# Altium footprint library PcbLib.PcbLib: 101 footprints (part 4 of 7)
Each footprint in its own frame and in the unit in brackets; x right, y up, seen from the top. Pads: shape width x height; smd on the part's side, far side on the other; paste and mask are expansions set on the pad; w line width, h text height; cw(c..) or ccw(c..) is an arc to the next point about the centre after c.
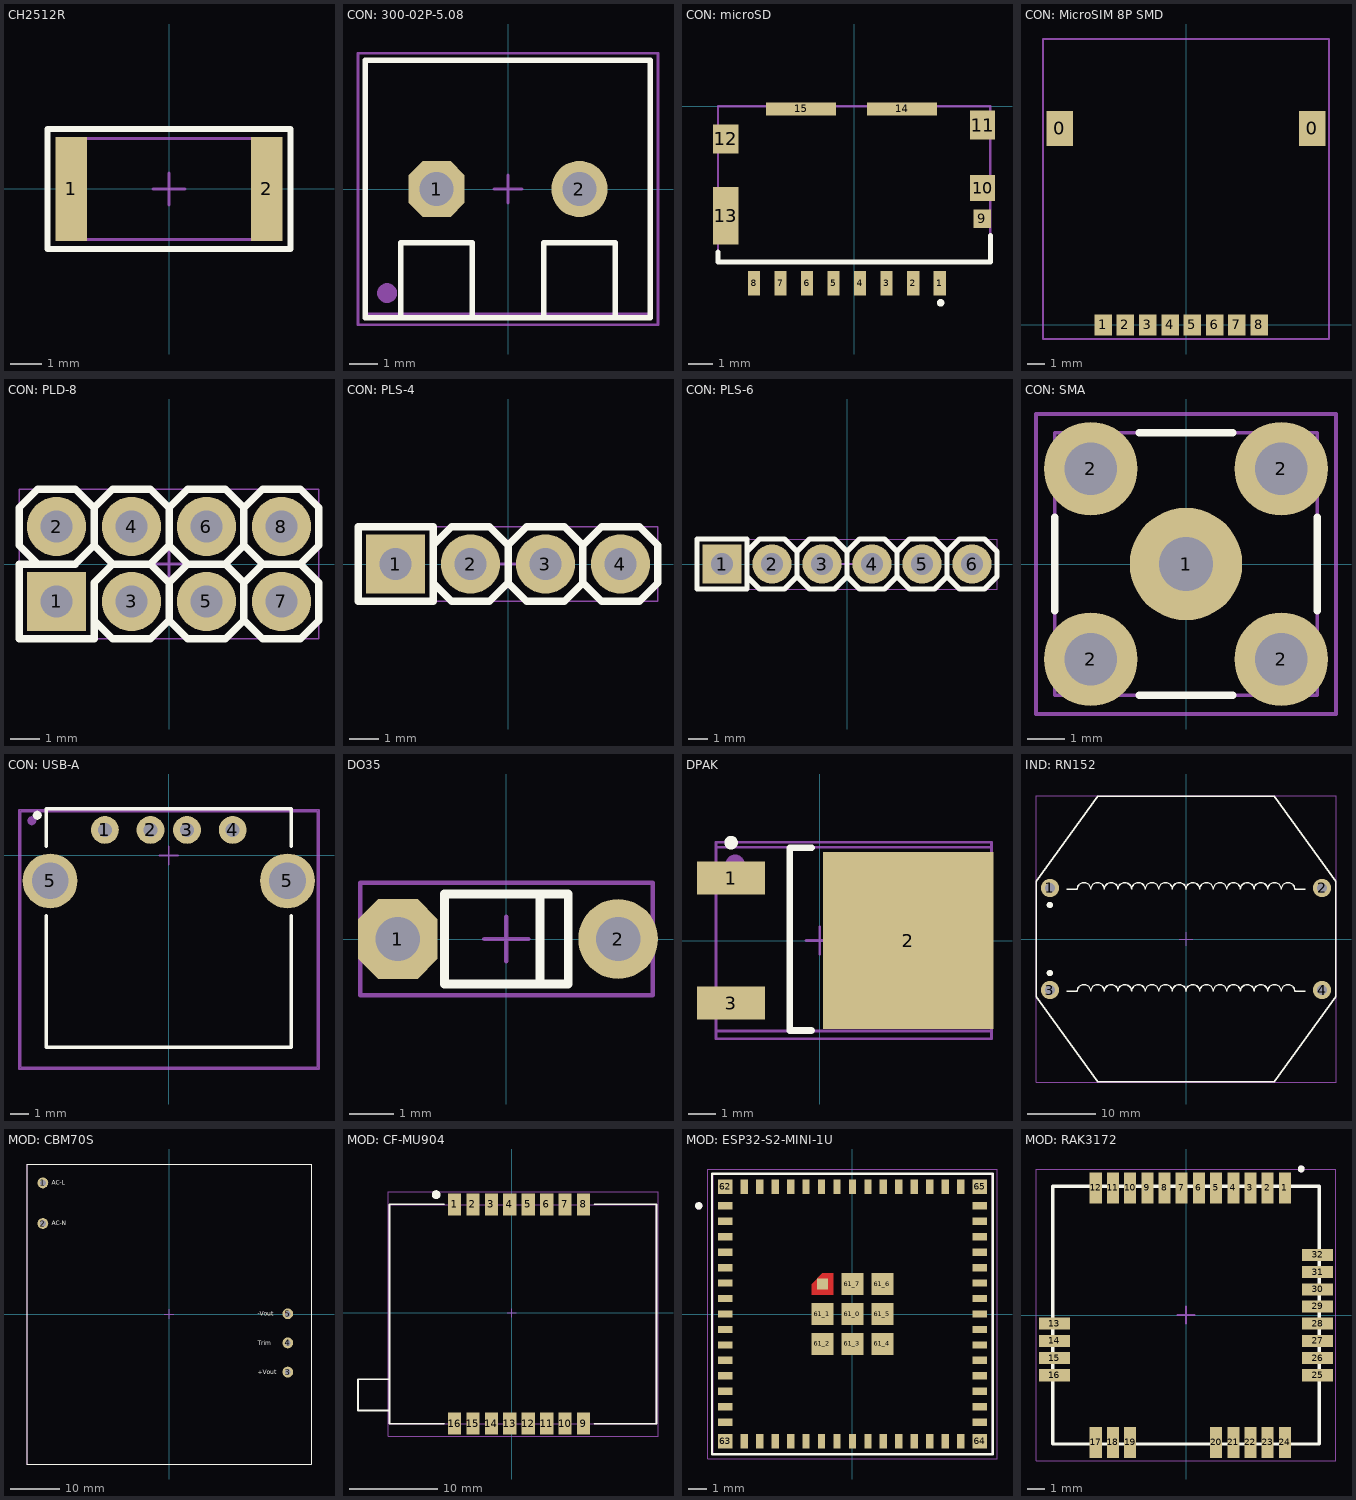
[diagram p3: the footprints below, top view; thin cyan lines are the x and y axes]

## CH2512R [mm]
height 0.55
pads (2):
  rect 1x3.3 smd: 1(-3.1,0) 2(3.1,0)
Top Overlay:
  lines w0.2: -3.85,-1.9 -3.85,1.9 3.85,1.9 3.85,-1.9 -3.85,-1.9
Top Assy:
  lines w0.1: -3.175,-1.6 -3.175,1.6 3.175,1.6 3.175,-1.6 -3.175,-1.6
Top Courtyard (Mech15):
  lines w0.1: -0.5,0 0.5,0 ; 0,-0.5 0,0.5 ; -3.85,-1.9 3.85,-1.9 3.85,1.9 -3.85,1.9 -3.85,-1.9
3D body "chip_2512_r.STEP": height 0.52, standoff -0.04, extent -3.175,-1.6 3.175,1.6

## CON: 300-02P-5.08 [mm] "2 pin 5.08mm screw connector"
height 12.5
pads (2):
  oct 2x2 hole 1.2: 1(-2.54,0)
  round 2 hole 1.2: 2(2.54,0)
Top Overlay:
  lines w0.2: -3.81,-4.572 -3.81,-1.905 -1.27,-1.905 -1.27,-4.445 ; 1.27,-4.572 1.27,-1.905 3.81,-1.905 3.81,-4.445 ; -5.08,-4.572 5.063,-4.572 5.063,4.572 -5.08,4.572 -5.08,-4.572
Top Assy:
  circle w0.5: c-4.3,-3.7 r0.1
  lines w0.1: -5.08,-4.445 -5.08,4.555 5.08,4.555 5.08,-4.445 -5.08,-4.445
Top Courtyard (Mech15):
  lines w0.1: -0.5,0 0.5,0 ; 0,-0.5 0,0.5 ; -5.334,-4.826 5.334,-4.826 5.334,4.826 -5.334,4.826 -5.334,-4.826
3D body "300-02.STEP": height 12.5, standoff -4, extent -5.08,-4.445 5.08,4.555

## CON: microSD [mm]
pads (15):
  rect 0.5x1 smd: 1(3.55,-7.34) 2(2.45,-7.34) 3(1.35,-7.34) 4(0.25,-7.34) 5(-0.85,-7.34) 6(-1.95,-7.34) 7(-3.05,-7.34) 8(-4.15,-7.34)
  rect 0.72x0.78 smd: 9(5.31,-4.66)
  rect 1.05x1.08 smd: 10(5.325,-3.39)
  rect 1.05x1.2 smd: 11(5.325,-0.78) 12(-5.325,-1.35)
  rect 1.05x2.39 smd: 13(-5.325,-4.535)
  rect 2.91x0.55 smd: 14(1.986,-0.105) 15(-2.204,-0.105)
Top Overlay:
  circle w0.2: c3.584,-8.15 r0.057
  lines w0.2: -5.65,-6.028 -5.65,-6.45 5.65,-6.45 5.65,-5.355
Top Assy:
  lines w0.1: -5.65,-6.45 -5.65,0 5.65,0 5.65,-6.45 -5.65,-6.45
3D body "1051620001--3DModel-STEP-56544.STEP": height 1.45, standoff 0, extent -5.65,-7.6 5.65,0

## CON: MicroSIM 8P SMD [mm] "8 Position Card Connector Micro SIM Surface Mount, Right Angle Gold"
height 1.95
pads (10):
  rect 1.5x2 smd: 0(-7.2,11.2) 0(7.2,11.2)
  rect 1x1.2 smd: 1(-4.72,0) 2(-3.45,0) 3(-2.18,0) 4(-0.91,0) 5(0.36,0) 6(1.63,0) 7(2.9,0) 8(4.17,0)
Top Courtyard (Mech15):
  lines w0.1: -8.15,-0.8 -8.15,16.3 8.15,16.3 8.15,-0.8 -8.15,-0.8

## CON: PLD-8 [mm] "PLD-40 8 pin header"
height 10
pads (8):
  rect 2x2 hole 1.1: 1(-3.81,-1.27)
  round 2 hole 1.1: 2(-3.81,1.27) 3(-1.27,-1.27) 4(-1.27,1.27) 5(1.27,-1.27) 6(1.27,1.27) 7(3.81,-1.27) 8(3.81,1.27)
Top Overlay:
  lines w0.254: -4.445,0 -5.08,0.635 -5.08,1.905 -4.445,2.54 ; -2.54,-1.905 -1.905,-2.54 -0.635,-2.54 0,-1.905 ; -4.445,2.54 -3.175,2.54 ; -4.445,2.54 -3.175,2.54 ; -3.175,2.54 -2.54,1.905 ; -2.54,0.635 -1.905,0 ; -2.54,0.635 -3.175,0 -5.08,0 -5.08,-2.54 -2.54,-2.54 -2.54,-0.635 -1.905,0 ; -2.54,0.635 -2.54,1.905 ; -2.54,1.905 -1.905,2.54 ; -1.905,0 -0.635,0 ; -1.905,2.54 -0.635,2.54 ; -1.905,2.54 -0.635,2.54 ; -0.635,0 0,0.635 ; -0.635,0 0,-0.635 ; -0.635,2.54 0,1.905 ; 0,-1.905 0.635,-2.54 1.905,-2.54 2.54,-1.905 ; 0,-1.905 0,-0.635 ; 0,-0.635 0.635,0 ; 0,0.635 0,1.905 ; 0,0.635 0.635,0 ; 0,1.905 0.635,2.54 ; 0.635,0 1.905,0 ; 0.635,2.54 1.905,2.54 ; 0.635,2.54 1.905,2.54 ; 1.905,0 2.54,0.635 ; 1.905,0 2.54,-0.635 ; 1.905,2.54 2.54,1.905 ; 2.54,-1.905 3.175,-2.54 4.445,-2.54 5.08,-1.905 5.08,-0.635 4.445,0 ; 2.54,-1.905 2.54,-0.635 ; 2.54,-0.635 3.175,0 ; 2.54,0.635 2.54,1.905 ; 2.54,0.635 3.175,0 ; 2.54,1.905 3.175,2.54 ; 3.175,0 4.445,0 ; 3.175,2.54 4.445,2.54 ; 3.175,2.54 4.445,2.54 ; 4.445,0 5.08,0.635 5.08,1.905 4.445,2.54
Top Assy:
  lines w0.1: -4.445,0 -5.08,0.635 -5.08,1.905 -4.445,2.54 -3.175,2.54 -2.54,1.905 -1.905,2.54 -0.635,2.54 0,1.905 ; -2.54,-1.905 -1.905,-2.54 -0.635,-2.54 0,-1.905 ; -1.905,0 -2.54,-0.635 -2.54,-2.54 -5.08,-2.54 -5.08,0 -3.175,0 -2.54,0.635 -1.905,0 ; -1.905,0 -0.635,0 ; -0.635,0 0,-0.635 ; -0.635,0 0,0.635 ; 0,-1.905 0.635,-2.54 1.905,-2.54 2.54,-1.905 ; 0,-1.905 0,-0.635 ; 0,-0.635 0.635,0 ; 0,0.635 0.635,0 ; 0,0.635 0,1.905 ; 0,1.905 0.635,2.54 1.905,2.54 2.54,1.905 ; 0.635,0 1.905,0 ; 1.905,0 2.54,-0.635 ; 1.905,0 2.54,0.635 ; 2.54,-1.905 3.175,-2.54 4.445,-2.54 5.08,-1.905 5.08,-0.635 4.445,0 ; 2.54,-1.905 2.54,-0.635 ; 2.54,-0.635 3.175,0 ; 2.54,0.635 3.175,0 ; 2.54,0.635 2.54,1.905 ; 2.54,1.905 3.175,2.54 4.445,2.54 5.08,1.905 5.08,0.635 4.445,0 ; 3.175,0 4.445,0
Top Courtyard (Mech15):
  lines w0.05: -5.08,-2.54 -5.08,2.54 5.08,2.54 5.08,-2.54 -5.08,-2.54
  lines w0.1: -0.5,0 0.5,0 ; 0,-0.5 0,0.5
3D body "PLD-8.STEP": height 8.54, standoff -3, extent -5.132,-2.546 5.028,2.534

## CON: PLS-4 [mm] "PLS-40 4 pin header"
height 10
pads (4):
  rect 2x2 hole 1.1: 1(-3.81,0)
  round 2 hole 1.1: 2(-1.27,0) 3(1.27,0) 4(3.81,0)
Top Overlay:
  lines w0.254: -2.54,-0.635 -1.905,-1.27 -0.635,-1.27 0,-0.635 ; -2.54,0.635 -1.905,1.27 -0.635,1.27 0,0.635 ; 0,-0.635 0.635,-1.27 1.905,-1.27 2.54,-0.635 ; 0,-0.635 0,0.635 ; 0,0.635 0.635,1.27 1.905,1.27 2.54,0.635 ; 2.54,-0.635 3.175,-1.27 4.445,-1.27 5.08,-0.635 5.08,0.635 4.445,1.27 3.175,1.27 2.54,0.635 ; 2.54,-0.635 2.54,0.635 ; -5.08,-1.27 -2.54,-1.27 -2.54,1.27 -5.08,1.27 -5.08,-1.27
Top Assy:
  lines w0.1: -2.54,-0.635 -1.905,-1.27 -0.635,-1.27 0,-0.635 ; -2.54,0.635 -1.905,1.27 -0.635,1.27 0,0.635 ; 0,-0.635 0.635,-1.27 1.905,-1.27 2.54,-0.635 ; 0,-0.635 0,0.635 ; 0,0.635 0.635,1.27 1.905,1.27 2.54,0.635 ; 2.54,-0.635 3.175,-1.27 4.445,-1.27 5.08,-0.635 5.08,0.635 4.445,1.27 3.175,1.27 2.54,0.635 ; 2.54,-0.635 2.54,0.635 ; -5.08,-1.27 -5.08,1.27 -2.54,1.27 -2.54,-1.27 -5.08,-1.27
Top Courtyard (Mech15):
  lines w0.05: -5.08,-1.27 -5.08,1.27 5.08,1.27 5.08,-1.27 -5.08,-1.27
  lines w0.1: -0.5,0 0.5,0 ; 0,-0.5 0,0.5
3D body "PLS-4.STEP": height 8.54, standoff -3, extent -5.08,-1.27 5.08,1.27

## CON: PLS-6 [mm]
height 10
pads (6):
  rect 2x2 hole 1.1: 1(-6.35,0)
  round 2 hole 1.1: 2(-3.81,0) 3(-1.27,0) 4(1.27,0) 5(3.81,0) 6(6.35,0)
Top Overlay:
  lines w0.254: -5.08,-0.635 -4.445,-1.27 -3.175,-1.27 -2.54,-0.635 ; -5.08,0.635 -4.445,1.27 -3.175,1.27 -2.54,0.635 ; -2.54,-0.635 -1.905,-1.27 -0.635,-1.27 0,-0.635 ; -2.54,-0.635 -2.54,0.635 ; -2.54,0.635 -1.905,1.27 -0.635,1.27 0,0.635 ; 0,-0.635 0.635,-1.27 1.905,-1.27 2.54,-0.635 ; 0,-0.635 0,0.635 ; 0,0.635 0.635,1.27 1.905,1.27 2.54,0.635 ; 2.54,-0.635 3.175,-1.27 4.445,-1.27 5.08,-0.635 ; 2.54,-0.635 2.54,0.635 ; 2.54,0.635 3.175,1.27 4.445,1.27 5.08,0.635 ; 5.08,-0.635 5.08,0.635 ; 5.08,-0.635 5.715,-1.27 6.985,-1.27 7.62,-0.635 7.62,0.635 6.985,1.27 5.715,1.27 5.08,0.635 ; -7.62,-1.27 -5.08,-1.27 -5.08,1.27 -7.62,1.27 -7.62,-1.27
Top Assy:
  lines w0.1: -5.08,-0.635 -4.445,-1.27 -3.175,-1.27 -2.54,-0.635 ; -5.08,0.635 -4.445,1.27 -3.175,1.27 -2.54,0.635 ; -2.54,-0.635 -1.905,-1.27 -0.635,-1.27 0,-0.635 ; -2.54,-0.635 -2.54,0.635 ; -2.54,0.635 -1.905,1.27 -0.635,1.27 0,0.635 ; 0,-0.635 0,0.635 ; 0,-0.635 0.635,-1.27 1.905,-1.27 2.54,-0.635 ; 0,0.635 0.635,1.27 1.905,1.27 2.54,0.635 ; 2.54,-0.635 2.54,0.635 ; 2.54,-0.635 3.175,-1.27 4.445,-1.27 5.08,-0.635 ; 2.54,0.635 3.175,1.27 4.445,1.27 5.08,0.635 ; 5.08,-0.635 5.08,0.635 ; 5.08,-0.635 5.715,-1.27 6.985,-1.27 7.62,-0.635 7.62,0.635 6.985,1.27 5.715,1.27 5.08,0.635 ; -7.62,-1.27 -5.08,-1.27 -5.08,1.27 -7.62,1.27 -7.62,-1.27
Top Courtyard (Mech15):
  lines w0.05: -7.62,-1.27 -7.62,1.27 7.62,1.27 7.62,-1.27 -7.62,-1.27
  lines w0.1: -0.5,0 0.5,0 ; 0,-0.5 0,0.5
3D body "PLS-6.STEP": height 8.54, standoff -3, extent -7.62,-1.27 7.62,1.27

## CON: SMA [mm]
pads (5):
  round 3 hole 1.45: 1(0,0)
  round 2.5 hole 1.4: 2(-2.54,-2.54) 2(-2.54,2.54) 2(2.54,-2.54) 2(2.54,2.54)
Top Overlay:
  lines w0.2: -3.5,-1.25 -3.5,1.25 ; -1.25,-3.5 1.25,-3.5 ; -1.25,3.5 1.25,3.5 ; 3.5,-1.25 3.5,1.25
Mechanical 1:
  lines w0.1: -3.5,-3.5 3.5,-3.5 3.5,3.5 -3.5,3.5 -3.5,-3.5
Top Courtyard (Mech15):
  lines w0.1: -0.5,0 0.5,0 ; 0,-0.5 0,0.5 ; -4,-4 -4,4 4,4 4,-4 -4,-4
3D body "SMA_connector.STEP": height 9.53, standoff -3.94, extent -3.5,-3.5 3.5,3.5

## CON: USB-A [mm]
height 5
pads (8):
  round 1.524 hole 0.762: 1(-3.5,1.397) 2(-1,1.397) 3(1,1.397) 4(3.5,1.397)
  round 3 hole 2: 5(-6.5,-1.397) 5(6.5,-1.397)
  round 0.5 on Mech13: ""(-7.5,1.9)
  round 0.5 on Top Overlay: ""(-7.2,2.2)
Top Overlay:
  lines w0.2: -6.7,-3.294 -6.7,-10.5 6.7,-10.5 6.7,-3.294 ; -6.7,0.5 -6.7,2.55 6.7,2.55 6.7,0.5
Top Assy:
  lines w0.1: -8.105,-11.593 -8.105,2.407 8.129,2.407 8.129,-11.593 -8.105,-11.593
Top Courtyard (Mech15):
  lines w0.1: -0.5,0 0.5,0 ; 0,-0.5 0,0.5 ; -8.2,-11.7 8.225,-11.7 8.225,2.5 -8.2,2.5 -8.2,-11.7
3D body "USB_A_PCB.STEP": height 7.66, standoff -3.62, extent -8.105,-11.593 8.129,2.407

## DO35 [mm]
height 3
pads (2):
  oct 1.8x1.8 hole 1: 1(-2.45,0)
  round 1.8 hole 1: 2(2.525,0)
Top Overlay:
  lines w0.2: 0.762,-1.016 0.762,1.016 ; -1.397,-1.016 1.397,-1.016 1.397,1.016 -1.397,1.016 -1.397,-1.016
Top Assy:
  lines w0.1: 0.762,-1.016 0.762,1.016 ; -1.397,-1.016 -1.397,1.016 1.397,1.016 1.397,-1.016 -1.397,-1.016
Top Courtyard (Mech15):
  lines w0.1: -0.5,0 0.5,0 ; 0,-0.5 0,0.5 ; -3.302,-1.27 3.302,-1.27 3.302,1.27 -3.302,1.27 -3.302,-1.27
3D body "DO-35.step": height 2.75, standoff -1.35, extent -2.7,-0.75 2.8,0.75

## DPAK [mm] "D-Pak, Body 6,2x6,7mm"
height 2.4
pads (3):
  rect 2.5x1.2 smd: 1(-3.25,2.29) 3(-3.25,-2.29)
  rect 6.25x6.5 smd: 2(3.25,0)
Top Overlay:
  circle w0.25: c-3.25,3.59 r0.125
  lines w0.25: -0.3,-3.3 -1.1,-3.3 -1.1,3.4 -0.3,3.4
Top Assy:
  circle w0.5: c-3.1,2.8 r0.1
  lines w0.1: -3.798,-3.317 -3.798,-3.317 ; -3.798,-3.317 -3.798,3.417 6.302,3.417 ; -3.798,-3.317 6.302,-3.317 6.302,3.417 ; 6.302,3.417 6.302,3.417
Top Courtyard (Mech15):
  lines w0.1: -0.5,0 0.5,0 ; 0,-0.5 0,0.5 ; -3.8,-3.6 -3.8,3.6 6.3,3.6 6.3,-3.6 -3.8,-3.6
3D body "User Library-DPAK_TO-252AA.STEP": height 2.37, standoff -0.03, extent -3.798,-3.317 6.302,3.417

## IND: RN152 [mm] "2 Line Common Mode Choke Through Hole Filter"
height 25
pads (4):
  round 2.7 hole 1.5: 1(-20,7.5) 2(20,7.5) 3(-20,-7.5) 4(20,-7.5)
Top Overlay:
  circle w0.5: c-20,-5 r0.224
  circle w0.5: c-20,5 r0.224
  lines w0.2: -17.5,-7.7 -16,-7.7 cw(c-15,-7.7) -14,-7.7 cw(c-13,-7.7) -12,-7.7 cw(c-11,-7.7) -10,-7.7 cw(c-9,-7.7) -8,-7.7 cw(c-7,-7.7) -6,-7.7 cw(c-5,-7.7) -4,-7.7 cw(c-3,-7.7) -2,-7.7 cw(c-1,-7.7) 0,-7.7 cw(c1,-7.7) 2,-7.7 cw(c3,-7.7) 4,-7.7 cw(c5,-7.7) 6,-7.7 cw(c7,-7.7) 8,-7.7 cw(c9,-7.7) 10,-7.7 cw(c11,-7.7) 12,-7.7 cw(c13,-7.7) 14,-7.7 cw(c15,-7.7) 16,-7.7 17.5,-7.7 ; -17.5,7.3 -16,7.3 cw(c-15,7.3) -14,7.3 cw(c-13,7.3) -12,7.3 cw(c-11,7.3) -10,7.3 cw(c-9,7.3) -8,7.3 cw(c-7,7.3) -6,7.3 cw(c-5,7.3) -4,7.3 cw(c-3,7.3) -2,7.3 cw(c-1,7.3) 0,7.3 cw(c1,7.3) 2,7.3 cw(c3,7.3) 4,7.3 cw(c5,7.3) 6,7.3 cw(c7,7.3) 8,7.3 cw(c9,7.3) 10,7.3 cw(c11,7.3) 12,7.3 cw(c13,7.3) 14,7.3 cw(c15,7.3) 16,7.3 17.5,7.3 ; -22,-8.5 -13,-21 13,-21 22,-8.5 22,8.5 13,21 -13,21 -22,8.5 -22,-8.5
Top Courtyard (Mech15):
  lines w0.1: -1,0 1,0 ; 0,-1 0,1 ; -22.05,-21.05 22.05,-21.05 22.05,21.05 -22.05,21.05 -22.05,-21.05
3D body "B82725A_V06_MAX_public-TDK-PC.step": height 23.98, standoff -5.02, extent -22,-21.2 22,21.2

## MOD: CBM70S [mm] "AC/DC CONVERTER"
height 17
pads (5):
  round 2.2 hole 1.2: 1(-25.65,26.66) 2(-25.65,18.4) 3(24.15,-11.8) 4(24.15,-5.88) 5(24.15,0.04)
Top Overlay:
  lines w0.2: -28.9,-30.5 -28.9,30.5 28.9,30.5 28.9,-30.5 -28.9,-30.5
  text "+Vout" at 18,-12.24 h0.9
  text "Trim" at 18,-6.32 h0.9
  text "-Vout" at 18,-0.4 h0.9
  text "AC-N" at -23.8,18.04 h0.9
  text "AC-L" at -23.8,26.3 h0.9
Top Assy:
  lines w0.1: -28.9,-30.5 28.9,-30.5 28.9,30.5 -28.9,30.5 -28.9,-30.5
Top Courtyard (Mech15):
  lines w0.1: -1,0 1,0 ; 0,-1 0,1 ; -28.9,-30.5 28.9,-30.5 28.9,30.5 -28.9,30.5 -28.9,-30.5
3D body "User Library-CBM70S.STEP": height 17, standoff -6.6, extent -28.95,-30.5 28.95,30.5

## MOD: CF-MU904 [mm] "UHF RFID reader module"
height 3.5
pads (16):
  rect 1.5x2.5 smd: 1(-6.509,12.373) 2(-4.409,12.373) 3(-2.309,12.373) 4(-0.209,12.373) 5(1.891,12.373) 6(3.991,12.373) 7(6.091,12.373) 8(8.191,12.373) 9(8.191,-12.627) 10(6.091,-12.627) 11(3.991,-12.627) 12(1.891,-12.627) 13(-0.209,-12.627) 14(-2.309,-12.627) 15(-4.409,-12.627) 16(-6.509,-12.627)
Top Overlay:
  circle w0.5: c-8.6,13.475 r0.251
  lines w0.2: -13.909,-11.127 -17.509,-11.127 -17.509,-7.566 -13.909,-7.566 ; -7.7,-12.627 -13.909,-12.627 -13.909,12.373 -7.7,12.373 ; 9.4,-12.627 16.491,-12.627 16.491,12.373 9.4,12.373
Top Assy:
  lines w0.127: -13.925,-12.625 -13.925,12.35 16.475,12.35 16.475,-12.625 -13.925,-12.625
  lines w0.2: -8.385,13.502 cw(c-8.6,13.5) -8.385,13.505
Top Courtyard (Mech15):
  lines w0.003: -0.026,-0.025 0.025,0.026
  lines w0.05: -14.075,-14.05 -14.075,13.8 16.675,13.8 16.675,-14.05 -14.075,-14.05
  lines w0.1: -0.5,0 0.5,0 ; 0,-0.5 0,0.5
3D body "CF-MU904.STEP": height 3.8, standoff 0, extent -17.85,-12.625 16.65,12.375

## MOD: ESP32-S2-MINI-1U [mm] "SMD MODULE, ESP32-S2FN4R2 WITH 4"
height 2.5
pads (73):
  rect 0.8x0.4 smd: 1(-7,5.95) 2(-7,5.1) 3(-7,4.25) 4(-7,3.4) 5(-7,2.55) 6(-7,1.7) 7(-7,0.85) 8(-7,0) 9(-7,-0.85) 10(-7,-1.7) 11(-7,-2.55) 12(-7,-3.4) 13(-7,-4.25) 14(-7,-5.1) 15(-7,-5.95) 31(7,-5.95) 32(7,-5.1) 33(7,-4.25) 34(7,-3.4) 35(7,-2.55) 36(7,-1.7) 37(7,-0.85) 38(7,0) 39(7,0.85) 40(7,1.7) 41(7,2.55) 42(7,3.4) 43(7,4.25) 44(7,5.1) 45(7,5.95)
  rect 0.4x0.8 smd: 16(-5.95,-7) 17(-5.1,-7) 18(-4.25,-7) 19(-3.4,-7) 20(-2.55,-7) 21(-1.7,-7) 22(-0.85,-7) 23(0,-7) 24(0.85,-7) 25(1.7,-7) 26(2.55,-7) 27(3.4,-7) 28(4.25,-7) 29(5.1,-7) 30(5.95,-7) 46(5.95,7) 47(5.1,7) 48(4.25,7) 49(3.4,7) 50(2.55,7) 51(1.7,7) 52(0.85,7) 53(0,7) 54(-0.85,7) 55(-1.7,7) 56(-2.55,7) 57(-3.4,7) 58(-4.25,7) 59(-5.1,7) 60(-5.95,7)
  rect 1.2x1.2 smd: 61_0(0,0) 61_1(-1.65,0) 61_2(-1.65,-1.65) 61_3(0,-1.65) 61_4(1.65,-1.65) 61_5(1.65,0) 61_6(1.65,1.65) 61_7(0,1.65)
  rect 0.6x0.6 smd paste-1 mask+0: 61_8(-1.65,1.65)
  rect 0.8x0.8 smd: 62(-7,7) 63(-7,-7) 64(7,-7) 65(7,7)
Top Layer:
  region: -1.05,1.05 -2.25,1.05 -2.25,1.65 -1.65,2.25 -1.05,2.25
Top Overlay:
  circle w0.2: c-8.45,5.95 r0.1
  lines w0.127: -7.72,-7.72 -7.72,7.72 7.72,7.72 7.72,-7.72 -7.72,-7.72
Top Paste:
  region: -1.05,1.05 -2.25,1.05 -2.25,1.65 -1.65,2.25 -1.05,2.25
Top Solder:
  region: -0.95,0.95 -2.35,0.95 -2.35,1.7 -1.7,2.35 -0.95,2.35
Top Assy:
  circle w0.2: c-8.45,5.95 r0.1
  lines w0.127: -7.7,-7.7 -7.7,7.7 7.7,7.7 7.7,-7.7 -7.7,-7.7
Top Courtyard (Mech15):
  lines w0.05: -7.95,-7.95 -7.95,7.95 7.95,7.95 7.95,-7.95 -7.95,-7.95
  lines w0.1: -0.5,0 0.5,0 ; 0,-0.5 0,0.5
3D body "step_temp.STEP": height 2.55, standoff 0, extent -7.7,-7.7 7.7,7.7

## MOD: RAK3172 [mm] "SMD RF MODULE"
height 3.5
pads (32):
  rect 0.7x1.8 smd: 1(5.75,7.4) 2(4.75,7.4) 3(3.75,7.4) 4(2.75,7.4) 5(1.75,7.4) 6(0.75,7.4) 7(-0.25,7.4) 8(-1.25,7.4) 9(-2.25,7.4) 10(-3.25,7.4) 11(-4.25,7.4) 12(-5.25,7.4) 17(-5.25,-7.4) 18(-4.25,-7.4) 19(-3.25,-7.4) 20(1.75,-7.4) 21(2.75,-7.4) 22(3.75,-7.4) 23(4.75,-7.4) 24(5.75,-7.4)
  rect 1.8x0.7 smd: 13(-7.65,-0.5) 14(-7.65,-1.5) 15(-7.65,-2.5) 16(-7.65,-3.5) 25(7.65,-3.5) 26(7.65,-2.5) 27(7.65,-1.5) 28(7.65,-0.5) 29(7.65,0.5) 30(7.65,1.5) 31(7.65,2.5) 32(7.65,3.5)
Top Overlay:
  circle w0.2: c6.7,8.5 r0.1
  lines w0.2: -7.75,-7.5 7.75,-7.5 7.75,7.5 -7.75,7.5 -7.75,-7.5
Top Assy:
  circle w0.2: c6.7,8.5 r0.1
  lines w0.127: -7.75,-7.5 7.75,-7.5 7.75,7.5 -7.75,7.5 -7.75,-7.5
Top Courtyard (Mech15):
  lines w0.05: -8.725,-8.475 8.725,-8.475 8.725,8.475 -8.725,8.475 -8.725,-8.475
  lines w0.1: -0.5,0 0.5,0 ; 0,-0.5 0,0.5
3D body "3D_RAK3172.stp": height 3.5, standoff -0.01, extent -7.75,-7.5 7.75,7.5